# Altium schematic symbol library jlcpcb_2025_04_inductors_extended_0603.schlib: 1269 symbols (part 5 of 7)
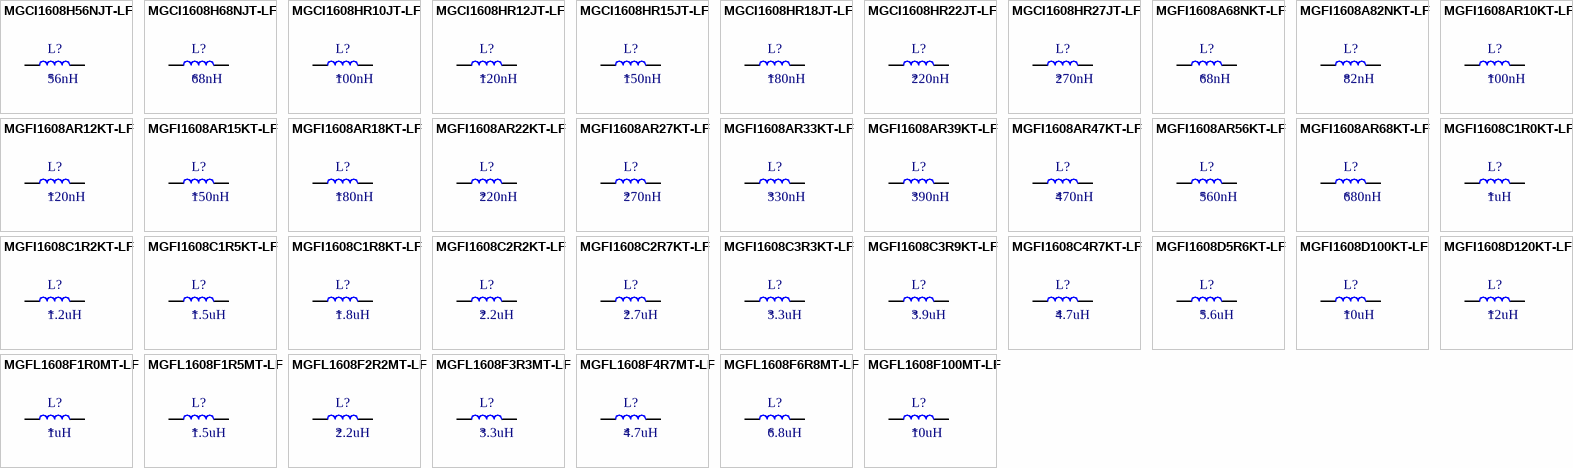
[diagram p35: symbols MGCI1608H56NJT-LF to MGFL1608F100MT-LF]

## MGCI1608HR27JT-LF
designator L?  Inductance: 270nH
Inductor, 270nH, ±5%, 2.4Ω, 300mA, SMD 0603; Manufacturer: microgate; Manufacturer Part Number: MGCI1608HR27JT-LF; Package Size: 0603; JLCPCB Basic Part: No; JLCPCB Part Number: C310887; Supplier 1: LCSC; Category: Inductors; Supplier Part Number 1: C310887; Tolerance: ±5%; Rated Current: 300mA; DC Resistance: 2.4Ω; RoHS: Yes; ComponentLink1Description: Datasheet; ComponentLink1URL: https://wmsc.lcsc.com/wmsc/upload/file/pdf/v2/lcsc/2304140030_microgate-MGCI1608HR27JT-LF_C310887.pdf; ComponentLink2Description: JLCPCB Part URL; ComponentLink2URL: https://jlcpcb.com/partdetail/C310887; ComponentLink3Description: LCSC Part URL; ComponentLink3URL: https://lcsc.com/product-detail/Inductors-SMD_microgate-microgate-MGCI1608HR27JT-LF_C310887.html
footprint IND-0603 (0603 (1608M) Inductor)
pins: 1, 2

## MGFI1608A68NKT-LF
designator L?  Inductance: 68nH
Inductor, 68nH, ±10%, 300mΩ, 50mA, SMD 0603; Manufacturer: microgate; Manufacturer Part Number: MGFI1608A68NKT-LF; Package Size: 0603; JLCPCB Basic Part: No; JLCPCB Part Number: C281041; Supplier 1: LCSC; Category: Inductors; Supplier Part Number 1: C281041; Tolerance: ±10%; Rated Current: 50mA; DC Resistance: 300mΩ; RoHS: Yes; ComponentLink1Description: Datasheet; ComponentLink1URL: https://wmsc.lcsc.com/wmsc/upload/file/pdf/v2/lcsc/2304140030_microgate-MGFI1608A68NKT-LF_C281041.pdf; ComponentLink2Description: JLCPCB Part URL; ComponentLink2URL: https://jlcpcb.com/partdetail/C281041; ComponentLink3Description: LCSC Part URL; ComponentLink3URL: https://lcsc.com/product-detail/Inductors-SMD_microgate-microgate-MGFI1608A68NKT-LF_C281041.html
footprint IND-0603 (0603 (1608M) Inductor)
pins: 1, 2

## MGFI1608A82NKT-LF
designator L?  Inductance: 82nH
Inductor, 82nH, ±10%, 300mΩ, 50mA, SMD 0603; Manufacturer: microgate; Manufacturer Part Number: MGFI1608A82NKT-LF; Package Size: 0603; JLCPCB Basic Part: No; JLCPCB Part Number: C281042; Supplier 1: LCSC; Category: Inductors; Supplier Part Number 1: C281042; Tolerance: ±10%; Rated Current: 50mA; DC Resistance: 300mΩ; RoHS: Yes; ComponentLink1Description: Datasheet; ComponentLink1URL: https://wmsc.lcsc.com/wmsc/upload/file/pdf/v2/lcsc/2304140030_microgate-MGFI1608A82NKT-LF_C281042.pdf; ComponentLink2Description: JLCPCB Part URL; ComponentLink2URL: https://jlcpcb.com/partdetail/C281042; ComponentLink3Description: LCSC Part URL; ComponentLink3URL: https://lcsc.com/product-detail/Inductors-SMD_microgate-microgate-MGFI1608A82NKT-LF_C281042.html
footprint IND-0603 (0603 (1608M) Inductor)
pins: 1, 2

## MGFI1608AR10KT-LF
designator L?  Inductance: 100nH
Inductor, 100nH, ±10%, 500mΩ, 50mA, SMD 0603; Manufacturer: microgate; Manufacturer Part Number: MGFI1608AR10KT-LF; Package Size: 0603; JLCPCB Basic Part: No; JLCPCB Part Number: C281043; Supplier 1: LCSC; Category: Inductors; Supplier Part Number 1: C281043; Tolerance: ±10%; Rated Current: 50mA; DC Resistance: 500mΩ; RoHS: Yes; ComponentLink1Description: Datasheet; ComponentLink1URL: https://wmsc.lcsc.com/wmsc/upload/file/pdf/v2/lcsc/2304140030_microgate-MGFI1608AR10KT-LF_C281043.pdf; ComponentLink2Description: JLCPCB Part URL; ComponentLink2URL: https://jlcpcb.com/partdetail/C281043; ComponentLink3Description: LCSC Part URL; ComponentLink3URL: https://lcsc.com/product-detail/Inductors-SMD_microgate-microgate-MGFI1608AR10KT-LF_C281043.html
footprint IND-0603 (0603 (1608M) Inductor)
pins: 1, 2

## MGFI1608AR12KT-LF
designator L?  Inductance: 120nH
Inductor, 120nH, ±10%, 500mΩ, 50mA, SMD 0603; Manufacturer: microgate; Manufacturer Part Number: MGFI1608AR12KT-LF; Package Size: 0603; JLCPCB Basic Part: No; JLCPCB Part Number: C281044; Supplier 1: LCSC; Category: Inductors; Supplier Part Number 1: C281044; Tolerance: ±10%; Rated Current: 50mA; DC Resistance: 500mΩ; RoHS: Yes; ComponentLink1Description: Datasheet; ComponentLink1URL: https://wmsc.lcsc.com/wmsc/upload/file/pdf/v2/lcsc/2304140030_microgate-MGFI1608AR12KT-LF_C281044.pdf; ComponentLink2Description: JLCPCB Part URL; ComponentLink2URL: https://jlcpcb.com/partdetail/C281044; ComponentLink3Description: LCSC Part URL; ComponentLink3URL: https://lcsc.com/product-detail/Inductors-SMD_microgate-microgate-MGFI1608AR12KT-LF_C281044.html
footprint IND-0603 (0603 (1608M) Inductor)
pins: 1, 2

## MGFI1608AR15KT-LF
designator L?  Inductance: 150nH
Inductor, 150nH, ±10%, 600mΩ, 50mA, SMD 0603; Manufacturer: microgate; Manufacturer Part Number: MGFI1608AR15KT-LF; Package Size: 0603; JLCPCB Basic Part: No; JLCPCB Part Number: C281045; Supplier 1: LCSC; Category: Inductors; Supplier Part Number 1: C281045; Tolerance: ±10%; Rated Current: 50mA; DC Resistance: 600mΩ; RoHS: Yes; ComponentLink1Description: Datasheet; ComponentLink1URL: https://wmsc.lcsc.com/wmsc/upload/file/pdf/v2/lcsc/2304140030_microgate-MGFI1608AR15KT-LF_C281045.pdf; ComponentLink2Description: JLCPCB Part URL; ComponentLink2URL: https://jlcpcb.com/partdetail/C281045; ComponentLink3Description: LCSC Part URL; ComponentLink3URL: https://lcsc.com/product-detail/Inductors-SMD_microgate-microgate-MGFI1608AR15KT-LF_C281045.html
footprint IND-0603 (0603 (1608M) Inductor)
pins: 1, 2

## MGFI1608AR18KT-LF
designator L?  Inductance: 180nH
Inductor, 180nH, ±10%, 600mΩ, 50mA, SMD 0603; Manufacturer: microgate; Manufacturer Part Number: MGFI1608AR18KT-LF; Package Size: 0603; JLCPCB Basic Part: No; JLCPCB Part Number: C281046; Supplier 1: LCSC; Category: Inductors; Supplier Part Number 1: C281046; Tolerance: ±10%; Rated Current: 50mA; DC Resistance: 600mΩ; RoHS: Yes; ComponentLink1Description: Datasheet; ComponentLink1URL: https://wmsc.lcsc.com/wmsc/upload/file/pdf/v2/lcsc/2304140030_microgate-MGFI1608AR18KT-LF_C281046.pdf; ComponentLink2Description: JLCPCB Part URL; ComponentLink2URL: https://jlcpcb.com/partdetail/C281046; ComponentLink3Description: LCSC Part URL; ComponentLink3URL: https://lcsc.com/product-detail/Inductors-SMD_microgate-microgate-MGFI1608AR18KT-LF_C281046.html
footprint IND-0603 (0603 (1608M) Inductor)
pins: 1, 2

## MGFI1608AR22KT-LF
designator L?  Inductance: 220nH
Inductor, 220nH, ±10%, 800mΩ, 50mA, SMD 0603; Manufacturer: microgate; Manufacturer Part Number: MGFI1608AR22KT-LF; Package Size: 0603; JLCPCB Basic Part: No; JLCPCB Part Number: C281047; Supplier 1: LCSC; Category: Inductors; Supplier Part Number 1: C281047; Tolerance: ±10%; Rated Current: 50mA; DC Resistance: 800mΩ; RoHS: Yes; ComponentLink1Description: Datasheet; ComponentLink1URL: https://wmsc.lcsc.com/wmsc/upload/file/pdf/v2/lcsc/2304140030_microgate-MGFI1608AR22KT-LF_C281047.pdf; ComponentLink2Description: JLCPCB Part URL; ComponentLink2URL: https://jlcpcb.com/partdetail/C281047; ComponentLink3Description: LCSC Part URL; ComponentLink3URL: https://lcsc.com/product-detail/Inductors-SMD_microgate-microgate-MGFI1608AR22KT-LF_C281047.html
footprint IND-0603 (0603 (1608M) Inductor)
pins: 1, 2

## MGFI1608AR27KT-LF
designator L?  Inductance: 270nH
Inductor, 270nH, ±10%, 800mΩ, 50mA, SMD 0603; Manufacturer: microgate; Manufacturer Part Number: MGFI1608AR27KT-LF; Package Size: 0603; JLCPCB Basic Part: No; JLCPCB Part Number: C281048; Supplier 1: LCSC; Category: Inductors; Supplier Part Number 1: C281048; Tolerance: ±10%; Rated Current: 50mA; DC Resistance: 800mΩ; RoHS: Yes; ComponentLink1Description: Datasheet; ComponentLink1URL: https://wmsc.lcsc.com/wmsc/upload/file/pdf/v2/lcsc/2304140030_microgate-MGFI1608AR27KT-LF_C281048.pdf; ComponentLink2Description: JLCPCB Part URL; ComponentLink2URL: https://jlcpcb.com/partdetail/C281048; ComponentLink3Description: LCSC Part URL; ComponentLink3URL: https://lcsc.com/product-detail/Inductors-SMD_microgate-microgate-MGFI1608AR27KT-LF_C281048.html
footprint IND-0603 (0603 (1608M) Inductor)
pins: 1, 2

## MGFI1608AR33KT-LF
designator L?  Inductance: 330nH
Inductor, 330nH, ±10%, 850mΩ, 35mA, SMD 0603; Manufacturer: microgate; Manufacturer Part Number: MGFI1608AR33KT-LF; Package Size: 0603; JLCPCB Basic Part: No; JLCPCB Part Number: C281049; Supplier 1: LCSC; Category: Inductors; Supplier Part Number 1: C281049; Tolerance: ±10%; Rated Current: 35mA; DC Resistance: 850mΩ; RoHS: Yes; ComponentLink1Description: Datasheet; ComponentLink1URL: https://wmsc.lcsc.com/wmsc/upload/file/pdf/v2/lcsc/2304140030_microgate-MGFI1608AR33KT-LF_C281049.pdf; ComponentLink2Description: JLCPCB Part URL; ComponentLink2URL: https://jlcpcb.com/partdetail/C281049; ComponentLink3Description: LCSC Part URL; ComponentLink3URL: https://lcsc.com/product-detail/Inductors-SMD_microgate-microgate-MGFI1608AR33KT-LF_C281049.html
footprint IND-0603 (0603 (1608M) Inductor)
pins: 1, 2

## MGFI1608AR39KT-LF
designator L?  Inductance: 390nH
Inductor, 390nH, ±10%, 1Ω, 35mA, SMD 0603; Manufacturer: microgate; Manufacturer Part Number: MGFI1608AR39KT-LF; Package Size: 0603; JLCPCB Basic Part: No; JLCPCB Part Number: C281050; Supplier 1: LCSC; Category: Inductors; Supplier Part Number 1: C281050; Tolerance: ±10%; Rated Current: 35mA; DC Resistance: 1Ω; RoHS: Yes; ComponentLink1Description: Datasheet; ComponentLink1URL: https://wmsc.lcsc.com/wmsc/upload/file/pdf/v2/lcsc/2304140030_microgate-MGFI1608AR39KT-LF_C281050.pdf; ComponentLink2Description: JLCPCB Part URL; ComponentLink2URL: https://jlcpcb.com/partdetail/C281050; ComponentLink3Description: LCSC Part URL; ComponentLink3URL: https://lcsc.com/product-detail/Inductors-SMD_microgate-microgate-MGFI1608AR39KT-LF_C281050.html
footprint IND-0603 (0603 (1608M) Inductor)
pins: 1, 2

## MGFI1608AR47KT-LF
designator L?  Inductance: 470nH
Inductor, 470nH, ±10%, 1.35Ω, 35mA, SMD 0603; Manufacturer: microgate; Manufacturer Part Number: MGFI1608AR47KT-LF; Package Size: 0603; JLCPCB Basic Part: No; JLCPCB Part Number: C281051; Supplier 1: LCSC; Category: Inductors; Supplier Part Number 1: C281051; Tolerance: ±10%; Rated Current: 35mA; DC Resistance: 1.35Ω; RoHS: Yes; ComponentLink1Description: Datasheet; ComponentLink1URL: https://wmsc.lcsc.com/wmsc/upload/file/pdf/v2/lcsc/2304140030_microgate-MGFI1608AR47KT-LF_C281051.pdf; ComponentLink2Description: JLCPCB Part URL; ComponentLink2URL: https://jlcpcb.com/partdetail/C281051; ComponentLink3Description: LCSC Part URL; ComponentLink3URL: https://lcsc.com/product-detail/Inductors-SMD_microgate-microgate-MGFI1608AR47KT-LF_C281051.html
footprint IND-0603 (0603 (1608M) Inductor)
pins: 1, 2

## MGFI1608AR56KT-LF
designator L?  Inductance: 560nH
Inductor, 560nH, ±10%, 1.55Ω, 35mA, SMD 0603; Manufacturer: microgate; Manufacturer Part Number: MGFI1608AR56KT-LF; Package Size: 0603; JLCPCB Basic Part: No; JLCPCB Part Number: C281052; Supplier 1: LCSC; Category: Inductors; Supplier Part Number 1: C281052; Tolerance: ±10%; Rated Current: 35mA; DC Resistance: 1.55Ω; RoHS: Yes; ComponentLink1Description: Datasheet; ComponentLink1URL: https://wmsc.lcsc.com/wmsc/upload/file/pdf/v2/lcsc/2304140030_microgate-MGFI1608AR56KT-LF_C281052.pdf; ComponentLink2Description: JLCPCB Part URL; ComponentLink2URL: https://jlcpcb.com/partdetail/C281052; ComponentLink3Description: LCSC Part URL; ComponentLink3URL: https://lcsc.com/product-detail/Inductors-SMD_microgate-microgate-MGFI1608AR56KT-LF_C281052.html
footprint IND-0603 (0603 (1608M) Inductor)
pins: 1, 2

## MGFI1608AR68KT-LF
designator L?  Inductance: 680nH
Inductor, 680nH, ±10%, 1.7Ω, 35mA, SMD 0603; Manufacturer: microgate; Manufacturer Part Number: MGFI1608AR68KT-LF; Package Size: 0603; JLCPCB Basic Part: No; JLCPCB Part Number: C281053; Supplier 1: LCSC; Category: Inductors; Supplier Part Number 1: C281053; Tolerance: ±10%; Rated Current: 35mA; DC Resistance: 1.7Ω; RoHS: Yes; ComponentLink1Description: Datasheet; ComponentLink1URL: https://wmsc.lcsc.com/wmsc/upload/file/pdf/v2/lcsc/2304140030_microgate-MGFI1608AR68KT-LF_C281053.pdf; ComponentLink2Description: JLCPCB Part URL; ComponentLink2URL: https://jlcpcb.com/partdetail/C281053; ComponentLink3Description: LCSC Part URL; ComponentLink3URL: https://lcsc.com/product-detail/Inductors-SMD_microgate-microgate-MGFI1608AR68KT-LF_C281053.html
footprint IND-0603 (0603 (1608M) Inductor)
pins: 1, 2

## MGFI1608C1R0KT-LF
designator L?  Inductance: 1uH
Inductor, 1uH, ±10%, 600mΩ, 25mA, SMD 0603; Manufacturer: microgate; Manufacturer Part Number: MGFI1608C1R0KT-LF; Package Size: 0603; JLCPCB Basic Part: No; JLCPCB Part Number: C281055; Supplier 1: LCSC; Category: Inductors; Supplier Part Number 1: C281055; Tolerance: ±10%; Rated Current: 25mA; DC Resistance: 600mΩ; RoHS: Yes; ComponentLink1Description: Datasheet; ComponentLink1URL: https://wmsc.lcsc.com/wmsc/upload/file/pdf/v2/lcsc/2304140030_microgate-MGFI1608C1R0KT-LF_C281055.pdf; ComponentLink2Description: JLCPCB Part URL; ComponentLink2URL: https://jlcpcb.com/partdetail/C281055; ComponentLink3Description: LCSC Part URL; ComponentLink3URL: https://lcsc.com/product-detail/Inductors-SMD_microgate-microgate-MGFI1608C1R0KT-LF_C281055.html
footprint IND-0603 (0603 (1608M) Inductor)
pins: 1, 2

## MGFI1608C1R2KT-LF
designator L?  Inductance: 1.2uH
Inductor, 1.2uH, ±10%, 800mΩ, 25mA, SMD 0603; Manufacturer: microgate; Manufacturer Part Number: MGFI1608C1R2KT-LF; Package Size: 0603; JLCPCB Basic Part: No; JLCPCB Part Number: C281056; Supplier 1: LCSC; Category: Inductors; Supplier Part Number 1: C281056; Tolerance: ±10%; Rated Current: 25mA; DC Resistance: 800mΩ; RoHS: Yes; ComponentLink1Description: Datasheet; ComponentLink1URL: https://wmsc.lcsc.com/wmsc/upload/file/pdf/v2/lcsc/2304140030_microgate-MGFI1608C1R2KT-LF_C281056.pdf; ComponentLink2Description: JLCPCB Part URL; ComponentLink2URL: https://jlcpcb.com/partdetail/C281056; ComponentLink3Description: LCSC Part URL; ComponentLink3URL: https://lcsc.com/product-detail/Inductors-SMD_microgate-microgate-MGFI1608C1R2KT-LF_C281056.html
footprint IND-0603 (0603 (1608M) Inductor)
pins: 1, 2

## MGFI1608C1R5KT-LF
designator L?  Inductance: 1.5uH
Inductor, 1.5uH, ±10%, 800mΩ, 25mA, SMD 0603; Manufacturer: microgate; Manufacturer Part Number: MGFI1608C1R5KT-LF; Package Size: 0603; JLCPCB Basic Part: No; JLCPCB Part Number: C281057; Supplier 1: LCSC; Category: Inductors; Supplier Part Number 1: C281057; Tolerance: ±10%; Rated Current: 25mA; DC Resistance: 800mΩ; RoHS: Yes; ComponentLink1Description: Datasheet; ComponentLink1URL: https://wmsc.lcsc.com/wmsc/upload/file/pdf/v2/lcsc/2304140030_microgate-MGFI1608C1R5KT-LF_C281057.pdf; ComponentLink2Description: JLCPCB Part URL; ComponentLink2URL: https://jlcpcb.com/partdetail/C281057; ComponentLink3Description: LCSC Part URL; ComponentLink3URL: https://lcsc.com/product-detail/Inductors-SMD_microgate-microgate-MGFI1608C1R5KT-LF_C281057.html
footprint IND-0603 (0603 (1608M) Inductor)
pins: 1, 2

## MGFI1608C1R8KT-LF
designator L?  Inductance: 1.8uH
Inductor, 1.8uH, ±10%, 950mΩ, 25mA, SMD 0603; Manufacturer: microgate; Manufacturer Part Number: MGFI1608C1R8KT-LF; Package Size: 0603; JLCPCB Basic Part: No; JLCPCB Part Number: C281058; Supplier 1: LCSC; Category: Inductors; Supplier Part Number 1: C281058; Tolerance: ±10%; Rated Current: 25mA; DC Resistance: 950mΩ; RoHS: Yes; ComponentLink1Description: Datasheet; ComponentLink1URL: https://wmsc.lcsc.com/wmsc/upload/file/pdf/v2/lcsc/2304140030_microgate-MGFI1608C1R8KT-LF_C281058.pdf; ComponentLink2Description: JLCPCB Part URL; ComponentLink2URL: https://jlcpcb.com/partdetail/C281058; ComponentLink3Description: LCSC Part URL; ComponentLink3URL: https://lcsc.com/product-detail/Inductors-SMD_microgate-microgate-MGFI1608C1R8KT-LF_C281058.html
footprint IND-0603 (0603 (1608M) Inductor)
pins: 1, 2

## MGFI1608C2R2KT-LF
designator L?  Inductance: 2.2uH
Inductor, 2.2uH, ±10%, 1.15Ω, 15mA, SMD 0603; Manufacturer: microgate; Manufacturer Part Number: MGFI1608C2R2KT-LF; Package Size: 0603; JLCPCB Basic Part: No; JLCPCB Part Number: C281059; Supplier 1: LCSC; Category: Inductors; Supplier Part Number 1: C281059; Tolerance: ±10%; Rated Current: 15mA; DC Resistance: 1.15Ω; RoHS: Yes; ComponentLink1Description: Datasheet; ComponentLink1URL: https://wmsc.lcsc.com/wmsc/upload/file/pdf/v2/lcsc/2304140030_microgate-MGFI1608C2R2KT-LF_C281059.pdf; ComponentLink2Description: JLCPCB Part URL; ComponentLink2URL: https://jlcpcb.com/partdetail/C281059; ComponentLink3Description: LCSC Part URL; ComponentLink3URL: https://lcsc.com/product-detail/Inductors-SMD_microgate-microgate-MGFI1608C2R2KT-LF_C281059.html
footprint IND-0603 (0603 (1608M) Inductor)
pins: 1, 2

## MGFI1608C2R7KT-LF
designator L?  Inductance: 2.7uH
Inductor, 2.7uH, ±10%, 1.35Ω, 15mA, SMD 0603; Manufacturer: microgate; Manufacturer Part Number: MGFI1608C2R7KT-LF; Package Size: 0603; JLCPCB Basic Part: No; JLCPCB Part Number: C281060; Supplier 1: LCSC; Category: Inductors; Supplier Part Number 1: C281060; Tolerance: ±10%; Rated Current: 15mA; DC Resistance: 1.35Ω; RoHS: Yes; ComponentLink1Description: Datasheet; ComponentLink1URL: https://wmsc.lcsc.com/wmsc/upload/file/pdf/v2/lcsc/2304140030_microgate-MGFI1608C2R7KT-LF_C281060.pdf; ComponentLink2Description: JLCPCB Part URL; ComponentLink2URL: https://jlcpcb.com/partdetail/C281060; ComponentLink3Description: LCSC Part URL; ComponentLink3URL: https://lcsc.com/product-detail/Inductors-SMD_microgate-microgate-MGFI1608C2R7KT-LF_C281060.html
footprint IND-0603 (0603 (1608M) Inductor)
pins: 1, 2

## MGFI1608C3R3KT-LF
designator L?  Inductance: 3.3uH
Inductor, 3.3uH, ±10%, 1.55Ω, 15mA, SMD 0603; Manufacturer: microgate; Manufacturer Part Number: MGFI1608C3R3KT-LF; Package Size: 0603; JLCPCB Basic Part: No; JLCPCB Part Number: C281061; Supplier 1: LCSC; Category: Inductors; Supplier Part Number 1: C281061; Tolerance: ±10%; Rated Current: 15mA; DC Resistance: 1.55Ω; RoHS: Yes; ComponentLink1Description: Datasheet; ComponentLink1URL: https://wmsc.lcsc.com/wmsc/upload/file/pdf/v2/lcsc/2304140030_microgate-MGFI1608C3R3KT-LF_C281061.pdf; ComponentLink2Description: JLCPCB Part URL; ComponentLink2URL: https://jlcpcb.com/partdetail/C281061; ComponentLink3Description: LCSC Part URL; ComponentLink3URL: https://lcsc.com/product-detail/Inductors-SMD_microgate-microgate-MGFI1608C3R3KT-LF_C281061.html
footprint IND-0603 (0603 (1608M) Inductor)
pins: 1, 2

## MGFI1608C3R9KT-LF
designator L?  Inductance: 3.9uH
Inductor, 3.9uH, ±10%, 1.7Ω, 15mA, SMD 0603; Manufacturer: microgate; Manufacturer Part Number: MGFI1608C3R9KT-LF; Package Size: 0603; JLCPCB Basic Part: No; JLCPCB Part Number: C281062; Supplier 1: LCSC; Category: Inductors; Supplier Part Number 1: C281062; Tolerance: ±10%; Rated Current: 15mA; DC Resistance: 1.7Ω; RoHS: Yes; ComponentLink1Description: Datasheet; ComponentLink1URL: https://wmsc.lcsc.com/wmsc/upload/file/pdf/v2/lcsc/2304140030_microgate-MGFI1608C3R9KT-LF_C281062.pdf; ComponentLink2Description: JLCPCB Part URL; ComponentLink2URL: https://jlcpcb.com/partdetail/C281062; ComponentLink3Description: LCSC Part URL; ComponentLink3URL: https://lcsc.com/product-detail/Inductors-SMD_microgate-microgate-MGFI1608C3R9KT-LF_C281062.html
footprint IND-0603 (0603 (1608M) Inductor)
pins: 1, 2

## MGFI1608C4R7KT-LF
designator L?  Inductance: 4.7uH
Inductor, 4.7uH, ±10%, 2.1Ω, 15mA, SMD 0603; Manufacturer: microgate; Manufacturer Part Number: MGFI1608C4R7KT-LF; Package Size: 0603; JLCPCB Basic Part: No; JLCPCB Part Number: C281063; Supplier 1: LCSC; Category: Inductors; Supplier Part Number 1: C281063; Tolerance: ±10%; Rated Current: 15mA; DC Resistance: 2.1Ω; RoHS: Yes; ComponentLink1Description: Datasheet; ComponentLink1URL: https://wmsc.lcsc.com/wmsc/upload/file/pdf/v2/lcsc/2304140030_microgate-MGFI1608C4R7KT-LF_C281063.pdf; ComponentLink2Description: JLCPCB Part URL; ComponentLink2URL: https://jlcpcb.com/partdetail/C281063; ComponentLink3Description: LCSC Part URL; ComponentLink3URL: https://lcsc.com/product-detail/Inductors-SMD_microgate-microgate-MGFI1608C4R7KT-LF_C281063.html
footprint IND-0603 (0603 (1608M) Inductor)
pins: 1, 2

## MGFI1608D5R6KT-LF
designator L?  Inductance: 5.6uH
Inductor, 5.6uH, ±10%, 1.55Ω, 5mA, SMD 0603; Manufacturer: microgate; Manufacturer Part Number: MGFI1608D5R6KT-LF; Package Size: 0603; JLCPCB Basic Part: No; JLCPCB Part Number: C281066; Supplier 1: LCSC; Category: Inductors; Supplier Part Number 1: C281066; Tolerance: ±10%; Rated Current: 5mA; DC Resistance: 1.55Ω; RoHS: Yes; ComponentLink1Description: Datasheet; ComponentLink1URL: https://wmsc.lcsc.com/wmsc/upload/file/pdf/v2/lcsc/2304140030_microgate-MGFI1608D5R6KT-LF_C281066.pdf; ComponentLink2Description: JLCPCB Part URL; ComponentLink2URL: https://jlcpcb.com/partdetail/C281066; ComponentLink3Description: LCSC Part URL; ComponentLink3URL: https://lcsc.com/product-detail/Inductors-SMD_microgate-microgate-MGFI1608D5R6KT-LF_C281066.html
footprint IND-0603 (0603 (1608M) Inductor)
pins: 1, 2

## MGFI1608D100KT-LF
designator L?  Inductance: 10uH
Inductor, 10uH, ±10%, 2.55Ω, 3mA, SMD 0603; Manufacturer: microgate; Manufacturer Part Number: MGFI1608D100KT-LF; Package Size: 0603; JLCPCB Basic Part: No; JLCPCB Part Number: C281064; Supplier 1: LCSC; Category: Inductors; Supplier Part Number 1: C281064; Tolerance: ±10%; Rated Current: 3mA; DC Resistance: 2.55Ω; RoHS: Yes; ComponentLink1Description: Datasheet; ComponentLink1URL: https://wmsc.lcsc.com/wmsc/upload/file/pdf/v2/lcsc/2304140030_microgate-MGFI1608D100KT-LF_C281064.pdf; ComponentLink2Description: JLCPCB Part URL; ComponentLink2URL: https://jlcpcb.com/partdetail/C281064; ComponentLink3Description: LCSC Part URL; ComponentLink3URL: https://lcsc.com/product-detail/Inductors-SMD_microgate-microgate-MGFI1608D100KT-LF_C281064.html
footprint IND-0603 (0603 (1608M) Inductor)
pins: 1, 2

## MGFI1608D120KT-LF
designator L?  Inductance: 12uH
Inductor, 12uH, ±10%, 2.75Ω, 3mA, SMD 0603; Manufacturer: microgate; Manufacturer Part Number: MGFI1608D120KT-LF; Package Size: 0603; JLCPCB Basic Part: No; JLCPCB Part Number: C281065; Supplier 1: LCSC; Category: Inductors; Supplier Part Number 1: C281065; Tolerance: ±10%; Rated Current: 3mA; DC Resistance: 2.75Ω; RoHS: Yes; ComponentLink1Description: Datasheet; ComponentLink1URL: https://wmsc.lcsc.com/wmsc/upload/file/pdf/v2/lcsc/2304140030_microgate-MGFI1608D120KT-LF_C281065.pdf; ComponentLink2Description: JLCPCB Part URL; ComponentLink2URL: https://jlcpcb.com/partdetail/C281065; ComponentLink3Description: LCSC Part URL; ComponentLink3URL: https://lcsc.com/product-detail/Inductors-SMD_microgate-microgate-MGFI1608D120KT-LF_C281065.html
footprint IND-0603 (0603 (1608M) Inductor)
pins: 1, 2

## MGFL1608F1R0MT-LF
designator L?  Inductance: 1uH
Inductor, 1uH, ±20%, 180mΩ, 1A, SMD 0603; Manufacturer: microgate; Manufacturer Part Number: MGFL1608F1R0MT-LF; Package Size: 0603; JLCPCB Basic Part: No; JLCPCB Part Number: C281108; Supplier 1: LCSC; Category: Inductors; Supplier Part Number 1: C281108; Tolerance: ±20%; Rated Current: 1A; DC Resistance: 180mΩ; RoHS: Yes; ComponentLink1Description: Datasheet; ComponentLink1URL: https://wmsc.lcsc.com/wmsc/upload/file/pdf/v2/lcsc/1811141852_microgate-MGFL1608F1R0MT-LF_C281108.pdf; ComponentLink2Description: JLCPCB Part URL; ComponentLink2URL: https://jlcpcb.com/partdetail/C281108; ComponentLink3Description: LCSC Part URL; ComponentLink3URL: https://lcsc.com/product-detail/Inductors-SMD_microgate-microgate-MGFL1608F1R0MT-LF_C281108.html
footprint IND-0603 (0603 (1608M) Inductor)
pins: 1, 2

## MGFL1608F1R5MT-LF
designator L?  Inductance: 1.5uH
Inductor, 1.5uH, ±20%, 220mΩ, 800mA, SMD 0603; Manufacturer: microgate; Manufacturer Part Number: MGFL1608F1R5MT-LF; Package Size: 0603; JLCPCB Basic Part: No; JLCPCB Part Number: C486327; Supplier 1: LCSC; Category: Inductors; Supplier Part Number 1: C486327; Tolerance: ±20%; Rated Current: 800mA; DC Resistance: 220mΩ; RoHS: Yes; ComponentLink1Description: Datasheet; ComponentLink1URL: https://wmsc.lcsc.com/wmsc/upload/file/pdf/v2/lcsc/2304140030_microgate-MGFL1608F1R5MT-LF_C486327.pdf; ComponentLink2Description: JLCPCB Part URL; ComponentLink2URL: https://jlcpcb.com/partdetail/C486327; ComponentLink3Description: LCSC Part URL; ComponentLink3URL: https://lcsc.com/product-detail/Inductors-SMD_microgate-microgate-MGFL1608F1R5MT-LF_C486327.html
footprint IND-0603 (0603 (1608M) Inductor)
pins: 1, 2

## MGFL1608F2R2MT-LF
designator L?  Inductance: 2.2uH
Inductor, 2.2uH, ±20%, 300mΩ, 700mA, SMD 0603; Manufacturer: microgate; Manufacturer Part Number: MGFL1608F2R2MT-LF; Package Size: 0603; JLCPCB Basic Part: No; JLCPCB Part Number: C281109; Supplier 1: LCSC; Category: Inductors; Supplier Part Number 1: C281109; Tolerance: ±20%; Rated Current: 700mA; DC Resistance: 300mΩ; RoHS: Yes; ComponentLink1Description: Datasheet; ComponentLink1URL: https://wmsc.lcsc.com/wmsc/upload/file/pdf/v2/lcsc/1811141846_microgate-MGFL1608F2R2MT-LF_C281109.pdf; ComponentLink2Description: JLCPCB Part URL; ComponentLink2URL: https://jlcpcb.com/partdetail/C281109; ComponentLink3Description: LCSC Part URL; ComponentLink3URL: https://lcsc.com/product-detail/Inductors-SMD_microgate-microgate-MGFL1608F2R2MT-LF_C281109.html
footprint IND-0603 (0603 (1608M) Inductor)
pins: 1, 2

## MGFL1608F3R3MT-LF
designator L?  Inductance: 3.3uH
Inductor, 3.3uH, ±20%, 400mΩ, 600mA, SMD 0603; Manufacturer: microgate; Manufacturer Part Number: MGFL1608F3R3MT-LF; Package Size: 0603; JLCPCB Basic Part: No; JLCPCB Part Number: C281110; Supplier 1: LCSC; Category: Inductors; Supplier Part Number 1: C281110; Tolerance: ±20%; Rated Current: 600mA; DC Resistance: 400mΩ; RoHS: Yes; ComponentLink1Description: Datasheet; ComponentLink1URL: https://wmsc.lcsc.com/wmsc/upload/file/pdf/v2/lcsc/1811151155_microgate-MGFL1608F3R3MT-LF_C281110.pdf; ComponentLink2Description: JLCPCB Part URL; ComponentLink2URL: https://jlcpcb.com/partdetail/C281110; ComponentLink3Description: LCSC Part URL; ComponentLink3URL: https://lcsc.com/product-detail/Inductors-SMD_microgate-microgate-MGFL1608F3R3MT-LF_C281110.html
footprint IND-0603 (0603 (1608M) Inductor)
pins: 1, 2

## MGFL1608F4R7MT-LF
designator L?  Inductance: 4.7uH
Inductor, 4.7uH, ±20%, 500mΩ, 500mA, SMD 0603; Manufacturer: microgate; Manufacturer Part Number: MGFL1608F4R7MT-LF; Package Size: 0603; JLCPCB Basic Part: No; JLCPCB Part Number: C281111; Supplier 1: LCSC; Category: Inductors; Supplier Part Number 1: C281111; Tolerance: ±20%; Rated Current: 500mA; DC Resistance: 500mΩ; RoHS: Yes; ComponentLink1Description: Datasheet; ComponentLink1URL: https://wmsc.lcsc.com/wmsc/upload/file/pdf/v2/lcsc/2304140030_microgate-MGFL1608F4R7MT-LF_C281111.pdf; ComponentLink2Description: JLCPCB Part URL; ComponentLink2URL: https://jlcpcb.com/partdetail/C281111; ComponentLink3Description: LCSC Part URL; ComponentLink3URL: https://lcsc.com/product-detail/Inductors-SMD_microgate-microgate-MGFL1608F4R7MT-LF_C281111.html
footprint IND-0603 (0603 (1608M) Inductor)
pins: 1, 2

## MGFL1608F6R8MT-LF
designator L?  Inductance: 6.8uH
Inductor, 6.8uH, ±20%, 530mΩ, 400mA, SMD 0603; Manufacturer: microgate; Manufacturer Part Number: MGFL1608F6R8MT-LF; Package Size: 0603; JLCPCB Basic Part: No; JLCPCB Part Number: C486328; Supplier 1: LCSC; Category: Inductors; Supplier Part Number 1: C486328; Tolerance: ±20%; Rated Current: 400mA; DC Resistance: 530mΩ; RoHS: Yes; ComponentLink1Description: Datasheet; ComponentLink1URL: https://wmsc.lcsc.com/wmsc/upload/file/pdf/v2/lcsc/2304140030_microgate-MGFL1608F6R8MT-LF_C486328.pdf; ComponentLink2Description: JLCPCB Part URL; ComponentLink2URL: https://jlcpcb.com/partdetail/C486328; ComponentLink3Description: LCSC Part URL; ComponentLink3URL: https://lcsc.com/product-detail/Inductors-SMD_microgate-microgate-MGFL1608F6R8MT-LF_C486328.html
footprint IND-0603 (0603 (1608M) Inductor)
pins: 1, 2

## MGFL1608F100MT-LF
designator L?  Inductance: 10uH
Inductor, 10uH, ±20%, 550mΩ, 400mA, SMD 0603; Manufacturer: microgate; Manufacturer Part Number: MGFL1608F100MT-LF; Package Size: 0603; JLCPCB Basic Part: No; JLCPCB Part Number: C281107; Supplier 1: LCSC; Category: Inductors; Supplier Part Number 1: C281107; Tolerance: ±20%; Rated Current: 400mA; DC Resistance: 550mΩ; RoHS: Yes; ComponentLink1Description: Datasheet; ComponentLink1URL: https://wmsc.lcsc.com/wmsc/upload/file/pdf/v2/lcsc/2304140030_microgate-MGFL1608F100MT-LF_C281107.pdf; ComponentLink2Description: JLCPCB Part URL; ComponentLink2URL: https://jlcpcb.com/partdetail/C281107; ComponentLink3Description: LCSC Part URL; ComponentLink3URL: https://lcsc.com/product-detail/Inductors-SMD_microgate-microgate-MGFL1608F100MT-LF_C281107.html
footprint IND-0603 (0603 (1608M) Inductor)
pins: 1, 2

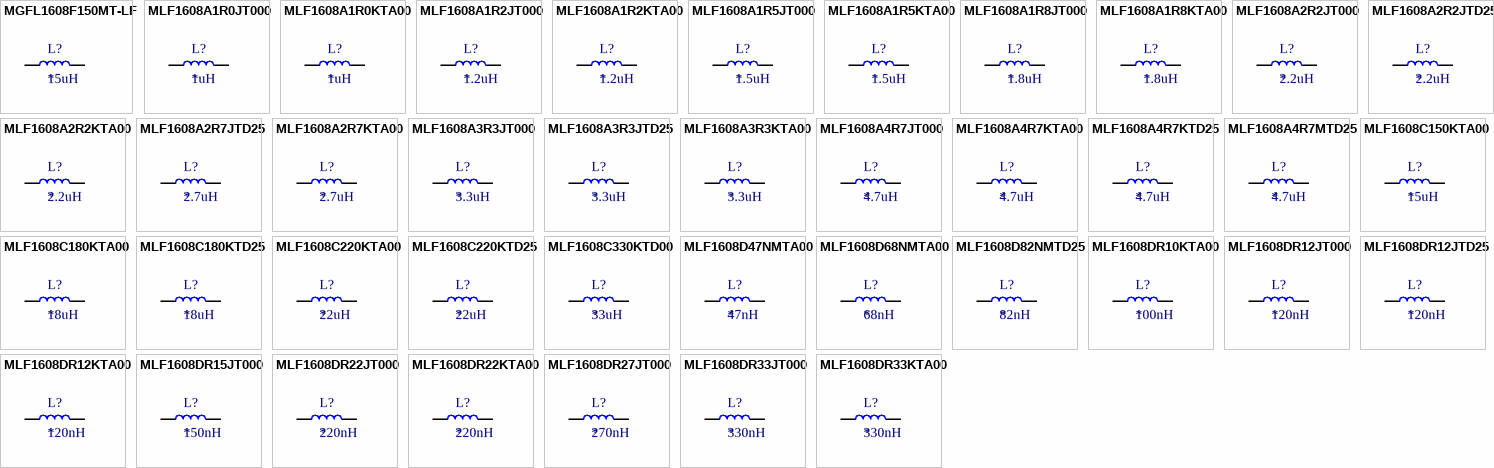
[diagram p20: symbols MGFL1608F150MT-LF to MLF1608DR33KTA00]

## MGFL1608F150MT-LF
designator L?  Inductance: 15uH
Inductor, 15uH, ±20%, 900mΩ, 220mA, SMD 0603; Manufacturer: microgate; Manufacturer Part Number: MGFL1608F150MT-LF; Package Size: 0603; JLCPCB Basic Part: No; JLCPCB Part Number: C486329; Supplier 1: LCSC; Category: Inductors; Supplier Part Number 1: C486329; Tolerance: ±20%; Rated Current: 220mA; DC Resistance: 900mΩ; RoHS: Yes; ComponentLink1Description: Datasheet; ComponentLink1URL: https://wmsc.lcsc.com/wmsc/upload/file/pdf/v2/lcsc/2304140030_microgate-MGFL1608F150MT-LF_C486329.pdf; ComponentLink2Description: JLCPCB Part URL; ComponentLink2URL: https://jlcpcb.com/partdetail/C486329; ComponentLink3Description: LCSC Part URL; ComponentLink3URL: https://lcsc.com/product-detail/Inductors-SMD_microgate-microgate-MGFL1608F150MT-LF_C486329.html
footprint IND-0603 (0603 (1608M) Inductor)
pins: 1, 2

## MLF1608A1R0JT000
designator L?  Inductance: 1uH
Inductor, 1uH, ±5%, 250mΩ, 50mA, SMD 0603; Manufacturer: TDK; Manufacturer Part Number: MLF1608A1R0JT000; Self-Resonant Frequency: 170MHz; Q Factor: 50@10MHz; Package Size: 0603; JLCPCB Basic Part: No; JLCPCB Part Number: C275338; Supplier 1: LCSC; Category: Inductors; Supplier Part Number 1: C275338; Tolerance: ±5%; Rated Current: 50mA; DC Resistance: 250mΩ; RoHS: Yes; ComponentLink1Description: Datasheet; ComponentLink1URL: https://wmsc.lcsc.com/wmsc/upload/file/pdf/v2/lcsc/2304140030_TDK-MLF1608A1R0JT000_C275338.pdf; ComponentLink2Description: JLCPCB Part URL; ComponentLink2URL: https://jlcpcb.com/partdetail/C275338; ComponentLink3Description: LCSC Part URL; ComponentLink3URL: https://lcsc.com/product-detail/Inductors-SMD_TDK-TDK-MLF1608A1R0JT000_C275338.html
footprint IND-0603 (0603 (1608M) Inductor)
pins: 1, 2

## MLF1608A1R0KTA00
designator L?  Inductance: 1uH
Inductor, 1uH, ±10%, 250mΩ, 50mA, SMD 0603; Manufacturer: TDK; Manufacturer Part Number: MLF1608A1R0KTA00; Self-Resonant Frequency: 120MHz; Q Factor: 35@10MHz; Package Size: 0603; JLCPCB Basic Part: No; JLCPCB Part Number: C275339; Supplier 1: LCSC; Category: Inductors; Supplier Part Number 1: C275339; Tolerance: ±10%; Rated Current: 50mA; DC Resistance: 250mΩ; RoHS: Yes; ComponentLink1Description: Datasheet; ComponentLink1URL: https://wmsc.lcsc.com/wmsc/upload/file/pdf/v2/lcsc/2304140030_TDK-MLF1608A1R0KTA00_C275339.pdf; ComponentLink2Description: JLCPCB Part URL; ComponentLink2URL: https://jlcpcb.com/partdetail/C275339; ComponentLink3Description: LCSC Part URL; ComponentLink3URL: https://lcsc.com/product-detail/Inductors-SMD_TDK-TDK-MLF1608A1R0KTA00_C275339.html
footprint IND-0603 (0603 (1608M) Inductor)
pins: 1, 2

## MLF1608A1R2JT000
designator L?  Inductance: 1.2uH
Inductor, 1.2uH, ±5%, 250mΩ, 50mA, SMD 0603; Manufacturer: TDK; Manufacturer Part Number: MLF1608A1R2JT000; Self-Resonant Frequency: 150MHz; Q Factor: 50@10MHz; Package Size: 0603; JLCPCB Basic Part: No; JLCPCB Part Number: C275340; Supplier 1: LCSC; Category: Inductors; Supplier Part Number 1: C275340; Tolerance: ±5%; Rated Current: 50mA; DC Resistance: 250mΩ; RoHS: Yes; ComponentLink1Description: Datasheet; ComponentLink1URL: https://wmsc.lcsc.com/wmsc/upload/file/pdf/v2/lcsc/2304140030_TDK-MLF1608A1R2JT000_C275340.pdf; ComponentLink2Description: JLCPCB Part URL; ComponentLink2URL: https://jlcpcb.com/partdetail/C275340; ComponentLink3Description: LCSC Part URL; ComponentLink3URL: https://lcsc.com/product-detail/Inductors-SMD_TDK-TDK-MLF1608A1R2JT000_C275340.html
footprint IND-0603 (0603 (1608M) Inductor)
pins: 1, 2

## MLF1608A1R2KTA00
designator L?  Inductance: 1.2uH
Inductor, 1.2uH, ±10%, 250mΩ, 50mA, SMD 0603; Manufacturer: TDK; Manufacturer Part Number: MLF1608A1R2KTA00; Self-Resonant Frequency: 110MHz; Q Factor: 35@10MHz; Package Size: 0603; JLCPCB Basic Part: No; JLCPCB Part Number: C275341; Supplier 1: LCSC; Category: Inductors; Supplier Part Number 1: C275341; Tolerance: ±10%; Rated Current: 50mA; DC Resistance: 250mΩ; RoHS: Yes; ComponentLink1Description: Datasheet; ComponentLink1URL: https://wmsc.lcsc.com/wmsc/upload/file/pdf/v2/lcsc/1811151443_TDK-MLF1608A1R2KTA00_C275341.pdf; ComponentLink2Description: JLCPCB Part URL; ComponentLink2URL: https://jlcpcb.com/partdetail/C275341; ComponentLink3Description: LCSC Part URL; ComponentLink3URL: https://lcsc.com/product-detail/Inductors-SMD_TDK-TDK-MLF1608A1R2KTA00_C275341.html
footprint IND-0603 (0603 (1608M) Inductor)
pins: 1, 2

## MLF1608A1R5JT000
designator L?  Inductance: 1.5uH
Inductor, 1.5uH, ±5%, 300mΩ, 50mA, SMD 0603; Manufacturer: TDK; Manufacturer Part Number: MLF1608A1R5JT000; Self-Resonant Frequency: 140MHz; Q Factor: 55@10MHz; Package Size: 0603; JLCPCB Basic Part: No; JLCPCB Part Number: C87514; Supplier 1: LCSC; Category: Inductors; Supplier Part Number 1: C87514; Tolerance: ±5%; Rated Current: 50mA; DC Resistance: 300mΩ; RoHS: Yes; ComponentLink1Description: Datasheet; ComponentLink1URL: https://wmsc.lcsc.com/wmsc/upload/file/pdf/v2/lcsc/2304140030_TDK-MLF1608A1R5JT000_C87514.pdf; ComponentLink2Description: JLCPCB Part URL; ComponentLink2URL: https://jlcpcb.com/partdetail/C87514; ComponentLink3Description: LCSC Part URL; ComponentLink3URL: https://lcsc.com/product-detail/Inductors-SMD_TDK-TDK-MLF1608A1R5JT000_C87514.html
footprint IND-0603 (0603 (1608M) Inductor)
pins: 1, 2

## MLF1608A1R5KTA00
designator L?  Inductance: 1.5uH
Inductor, 1.5uH, ±10%, 300mΩ, 50mA, SMD 0603; Manufacturer: TDK; Manufacturer Part Number: MLF1608A1R5KTA00; Self-Resonant Frequency: 140MHz; Q Factor: 35@10MHz; Package Size: 0603; JLCPCB Basic Part: No; JLCPCB Part Number: C524465; Supplier 1: LCSC; Category: Inductors; Supplier Part Number 1: C524465; Tolerance: ±10%; Rated Current: 50mA; DC Resistance: 300mΩ; RoHS: Yes; ComponentLink1Description: Datasheet; ComponentLink1URL: https://wmsc.lcsc.com/wmsc/upload/file/pdf/v2/lcsc/2304140030_TDK-MLF1608A1R5KTA00_C524465.pdf; ComponentLink2Description: JLCPCB Part URL; ComponentLink2URL: https://jlcpcb.com/partdetail/C524465; ComponentLink3Description: LCSC Part URL; ComponentLink3URL: https://lcsc.com/product-detail/Inductors-SMD_TDK-TDK-MLF1608A1R5KTA00_C524465.html
footprint IND-0603 (0603 (1608M) Inductor)
pins: 1, 2

## MLF1608A1R8JT000
designator L?  Inductance: 1.8uH
Inductor, 1.8uH, ±5%, 350mΩ, 50mA, SMD 0603; Manufacturer: TDK; Manufacturer Part Number: MLF1608A1R8JT000; Self-Resonant Frequency: 130MHz; Q Factor: 55@10MHz; Package Size: 0603; JLCPCB Basic Part: No; JLCPCB Part Number: C275343; Supplier 1: LCSC; Category: Inductors; Supplier Part Number 1: C275343; Tolerance: ±5%; Rated Current: 50mA; DC Resistance: 350mΩ; RoHS: Yes; ComponentLink1Description: Datasheet; ComponentLink1URL: https://wmsc.lcsc.com/wmsc/upload/file/pdf/v2/lcsc/2304140030_TDK-MLF1608A1R8JT000_C275343.pdf; ComponentLink2Description: JLCPCB Part URL; ComponentLink2URL: https://jlcpcb.com/partdetail/C275343; ComponentLink3Description: LCSC Part URL; ComponentLink3URL: https://lcsc.com/product-detail/Inductors-SMD_TDK-TDK-MLF1608A1R8JT000_C275343.html
footprint IND-0603 (0603 (1608M) Inductor)
pins: 1, 2

## MLF1608A1R8KTA00
designator L?  Inductance: 1.8uH
Inductor, 1.8uH, ±10%, 350mΩ, 50mA, SMD 0603; Manufacturer: TDK; Manufacturer Part Number: MLF1608A1R8KTA00; Self-Resonant Frequency: 90MHz; Q Factor: 35@10MHz; Package Size: 0603; JLCPCB Basic Part: No; JLCPCB Part Number: C275344; Supplier 1: LCSC; Category: Inductors; Supplier Part Number 1: C275344; Tolerance: ±10%; Rated Current: 50mA; DC Resistance: 350mΩ; RoHS: Yes; ComponentLink1Description: Datasheet; ComponentLink1URL: https://wmsc.lcsc.com/wmsc/upload/file/pdf/v2/lcsc/2304140030_TDK-MLF1608A1R8KTA00_C275344.pdf; ComponentLink2Description: JLCPCB Part URL; ComponentLink2URL: https://jlcpcb.com/partdetail/C275344; ComponentLink3Description: LCSC Part URL; ComponentLink3URL: https://lcsc.com/product-detail/Inductors-SMD_TDK-TDK-MLF1608A1R8KTA00_C275344.html
footprint IND-0603 (0603 (1608M) Inductor)
pins: 1, 2

## MLF1608A2R2JT000
designator L?  Inductance: 2.2uH
Inductor, 2.2uH, ±5%, 450mΩ, 30mA, SMD 0603; Manufacturer: TDK; Manufacturer Part Number: MLF1608A2R2JT000; Self-Resonant Frequency: 80MHz; Q Factor: 35@10MHz; Package Size: 0603; JLCPCB Basic Part: No; JLCPCB Part Number: C114778; Supplier 1: LCSC; Category: Inductors; Supplier Part Number 1: C114778; Tolerance: ±5%; Rated Current: 30mA; DC Resistance: 450mΩ; RoHS: Yes; ComponentLink1Description: Datasheet; ComponentLink1URL: https://wmsc.lcsc.com/wmsc/upload/file/pdf/v2/lcsc/2304140030_TDK-MLF1608A2R2JT000_C114778.pdf; ComponentLink2Description: JLCPCB Part URL; ComponentLink2URL: https://jlcpcb.com/partdetail/C114778; ComponentLink3Description: LCSC Part URL; ComponentLink3URL: https://lcsc.com/product-detail/Inductors-SMD_TDK-TDK-MLF1608A2R2JT000_C114778.html
footprint IND-0603 (0603 (1608M) Inductor)
pins: 1, 2

## MLF1608A2R2JTD25
designator L?  Inductance: 2.2uH
Inductor, 2.2uH, ±5%, 450mΩ, 30mA, SMD 0603; Manufacturer: TDK; Manufacturer Part Number: MLF1608A2R2JTD25; Self-Resonant Frequency: 80MHz; Q Factor: 35@10MHz; Package Size: 0603; JLCPCB Basic Part: No; JLCPCB Part Number: C275345; Supplier 1: LCSC; Category: Inductors; Supplier Part Number 1: C275345; Tolerance: ±5%; Rated Current: 30mA; DC Resistance: 450mΩ; RoHS: Yes; ComponentLink1Description: Datasheet; ComponentLink1URL: https://wmsc.lcsc.com/wmsc/upload/file/pdf/v2/lcsc/2304140030_TDK-MLF1608A2R2JTD25_C275345.pdf; ComponentLink2Description: JLCPCB Part URL; ComponentLink2URL: https://jlcpcb.com/partdetail/C275345; ComponentLink3Description: LCSC Part URL; ComponentLink3URL: https://lcsc.com/product-detail/Inductors-SMD_TDK-TDK-MLF1608A2R2JTD25_C275345.html
footprint IND-0603 (0603 (1608M) Inductor)
pins: 1, 2

## MLF1608A2R2KTA00
designator L?  Inductance: 2.2uH
Inductor, 2.2uH, ±10%, 450mΩ, 30mA, SMD 0603; Manufacturer: TDK; Manufacturer Part Number: MLF1608A2R2KTA00; Self-Resonant Frequency: 80MHz; Q Factor: 35@10MHz; Package Size: 0603; JLCPCB Basic Part: No; JLCPCB Part Number: C136253; Supplier 1: LCSC; Category: Inductors; Supplier Part Number 1: C136253; Tolerance: ±10%; Rated Current: 30mA; DC Resistance: 450mΩ; RoHS: Yes; ComponentLink1Description: Datasheet; ComponentLink1URL: https://wmsc.lcsc.com/wmsc/upload/file/pdf/v2/lcsc/2304140030_TDK-MLF1608A2R2KTA00_C136253.pdf; ComponentLink2Description: JLCPCB Part URL; ComponentLink2URL: https://jlcpcb.com/partdetail/C136253; ComponentLink3Description: LCSC Part URL; ComponentLink3URL: https://lcsc.com/product-detail/Inductors-SMD_TDK-TDK-MLF1608A2R2KTA00_C136253.html
footprint IND-0603 (0603 (1608M) Inductor)
pins: 1, 2

## MLF1608A2R7JTD25
designator L?  Inductance: 2.7uH
Inductor, 2.7uH, ±5%, 500mΩ, 30mA, SMD 0603; Manufacturer: TDK; Manufacturer Part Number: MLF1608A2R7JTD25; Self-Resonant Frequency: 110MHz; Q Factor: 55@10MHz; Package Size: 0603; JLCPCB Basic Part: No; JLCPCB Part Number: C404524; Supplier 1: LCSC; Category: Inductors; Supplier Part Number 1: C404524; Tolerance: ±5%; Rated Current: 30mA; DC Resistance: 500mΩ; RoHS: Yes; ComponentLink1Description: Datasheet; ComponentLink1URL: https://wmsc.lcsc.com/wmsc/upload/file/pdf/v2/lcsc/2304140030_TDK-MLF1608A2R7JTD25_C404524.pdf; ComponentLink2Description: JLCPCB Part URL; ComponentLink2URL: https://jlcpcb.com/partdetail/C404524; ComponentLink3Description: LCSC Part URL; ComponentLink3URL: https://lcsc.com/product-detail/Inductors-SMD_TDK-TDK-MLF1608A2R7JTD25_C404524.html
footprint IND-0603 (0603 (1608M) Inductor)
pins: 1, 2

## MLF1608A2R7KTA00
designator L?  Inductance: 2.7uH
Inductor, 2.7uH, ±10%, 500mΩ, 30mA, SMD 0603; Manufacturer: TDK; Manufacturer Part Number: MLF1608A2R7KTA00; Self-Resonant Frequency: 70MHz; Q Factor: 35@10MHz; Package Size: 0603; JLCPCB Basic Part: No; JLCPCB Part Number: C531338; Supplier 1: LCSC; Category: Inductors; Supplier Part Number 1: C531338; Tolerance: ±10%; Rated Current: 30mA; DC Resistance: 500mΩ; RoHS: Yes; ComponentLink1Description: Datasheet; ComponentLink1URL: https://wmsc.lcsc.com/wmsc/upload/file/pdf/v2/lcsc/2009181806_TDK-MLF1608A2R7KTA00_C531338.pdf; ComponentLink2Description: JLCPCB Part URL; ComponentLink2URL: https://jlcpcb.com/partdetail/C531338; ComponentLink3Description: LCSC Part URL; ComponentLink3URL: https://lcsc.com/product-detail/Inductors-SMD_TDK-TDK-MLF1608A2R7KTA00_C531338.html
footprint IND-0603 (0603 (1608M) Inductor)
pins: 1, 2

## MLF1608A3R3JT000
designator L?  Inductance: 3.3uH
Inductor, 3.3uH, ±5%, 550mΩ, 30mA, SMD 0603; Manufacturer: TDK; Manufacturer Part Number: MLF1608A3R3JT000; Self-Resonant Frequency: 65MHz; Q Factor: 35@10MHz; Package Size: 0603; JLCPCB Basic Part: No; JLCPCB Part Number: C275346; Supplier 1: LCSC; Category: Inductors; Supplier Part Number 1: C275346; Tolerance: ±5%; Rated Current: 30mA; DC Resistance: 550mΩ; RoHS: Yes; ComponentLink1Description: Datasheet; ComponentLink1URL: https://wmsc.lcsc.com/wmsc/upload/file/pdf/v2/lcsc/2304140030_TDK-MLF1608A3R3JT000_C275346.pdf; ComponentLink2Description: JLCPCB Part URL; ComponentLink2URL: https://jlcpcb.com/partdetail/C275346; ComponentLink3Description: LCSC Part URL; ComponentLink3URL: https://lcsc.com/product-detail/Inductors-SMD_TDK-TDK-MLF1608A3R3JT000_C275346.html
footprint IND-0603 (0603 (1608M) Inductor)
pins: 1, 2
